# Altium footprint library Capacitor.PcbLib: 59 footprints (part 2 of 4)
Each footprint in its own frame and in the unit in brackets; x right, y up, seen from the top. Pads: shape width x height; smd on the part's side, far side on the other; paste and mask are expansions set on the pad; w line width, h text height; cw(c..) or ccw(c..) is an arc to the next point about the centre after c.
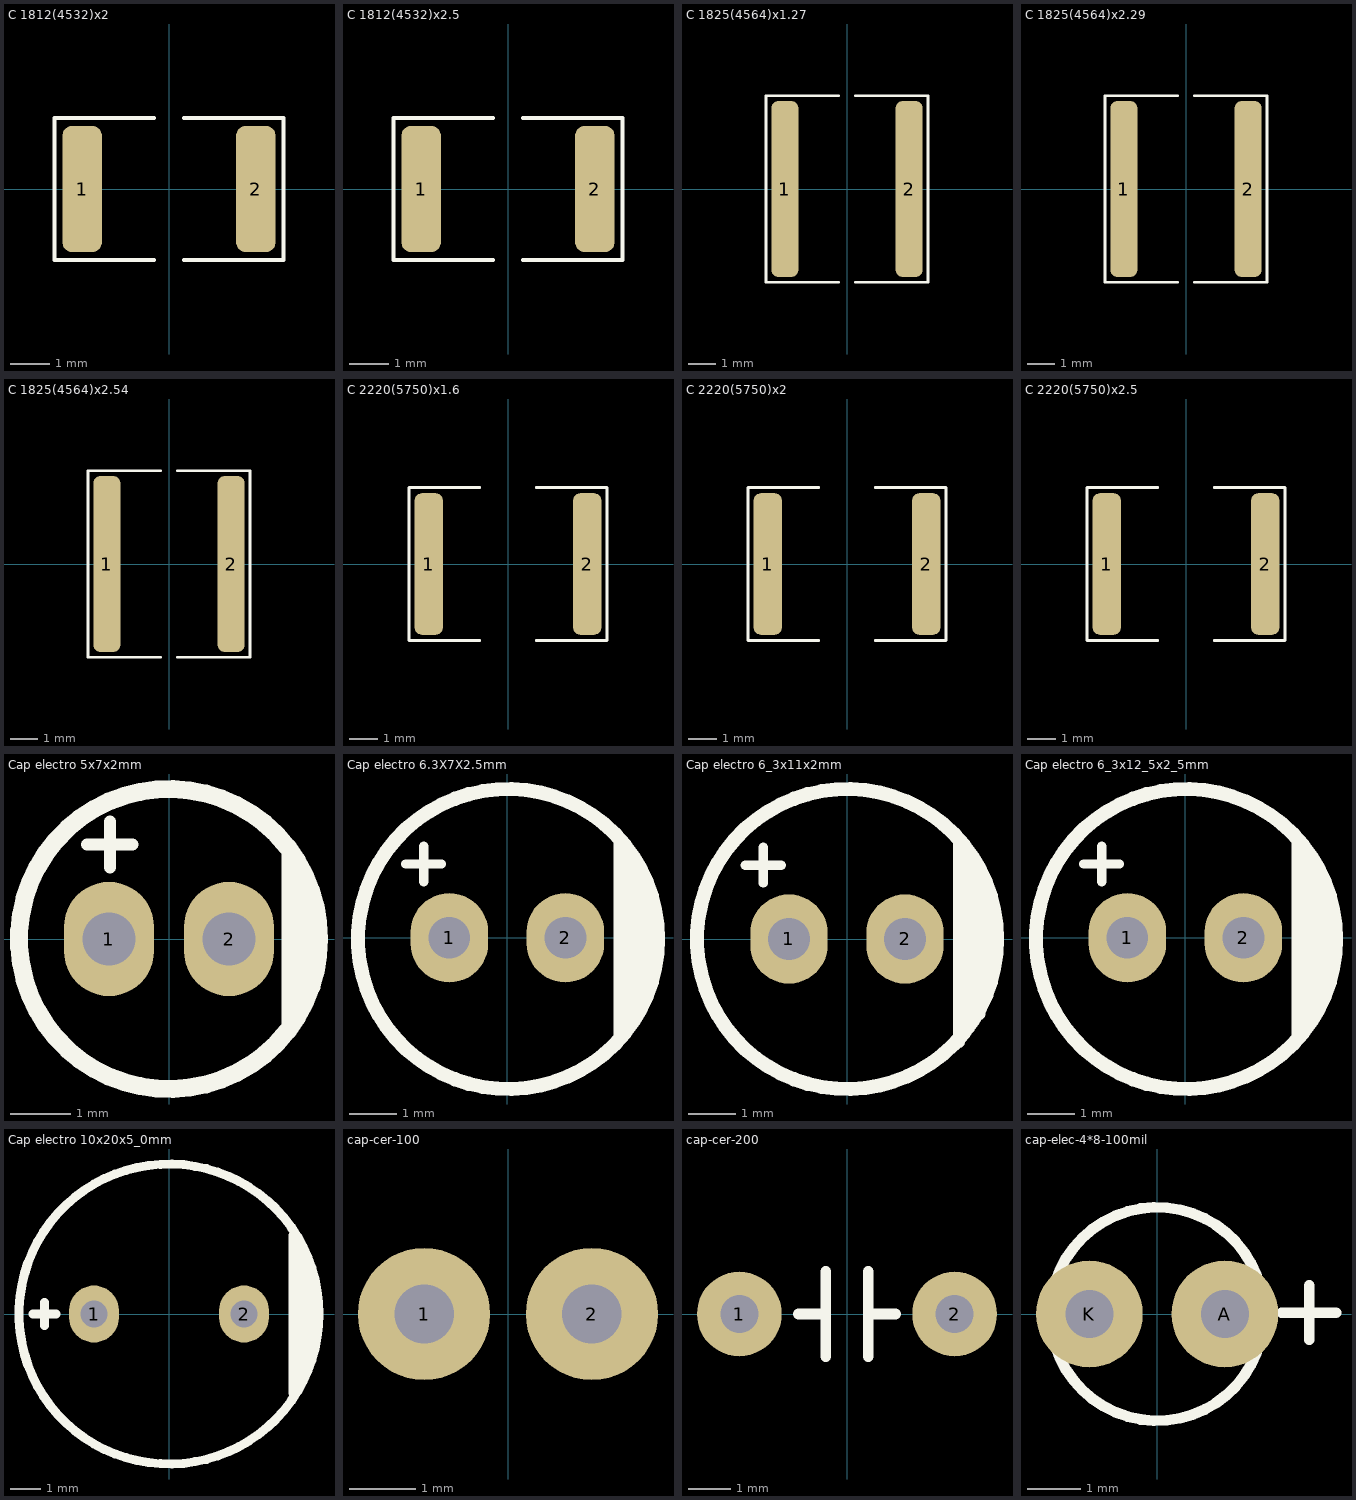
[diagram p1: the footprints below, top view; thin cyan lines are the x and y axes]

## C 1812(4532)x2 [mm]
height 2
pads (2):
  rrect50% 1x3.2 smd: 1(-2.2,0) 2(2.2,0)
Top Overlay:
  lines w0.1: -0.375,-1.8 -2.9,-1.8 -2.9,1.8 -0.375,1.8 ; 0.375,-1.8 2.9,-1.8 2.9,1.8 0.375,1.8
3D body "Cap 1812(4532)x200N.STEP": height 2.01, standoff 0, extent -2.25,-1.6 2.25,1.6

## C 1812(4532)x2.5 [mm]
height 2.5
pads (2):
  rrect50% 1x3.2 smd: 1(-2.2,0) 2(2.2,0)
Top Overlay:
  lines w0.1: -0.375,-1.8 -2.9,-1.8 -2.9,1.8 -0.375,1.8 ; 0.375,-1.8 2.9,-1.8 2.9,1.8 0.375,1.8
3D body "Cap 1812(4532)x250N.STEP": height 2.51, standoff 0, extent -2.25,-1.6 2.25,1.6

## C 1825(4564)x1.27 [mm]
height 1.27
pads (2):
  rrect50% 1x6.5 smd: 1(-2.3,0) 2(2.3,0)
Top Overlay:
  lines w0.1: -0.3,-3.45 -3,-3.45 -3,3.45 -0.3,3.45 ; 0.3,-3.45 3,-3.45 3,3.45 0.3,3.45
3D body "Cap 1825(4564)x127N.STEP": height 1.28, standoff 0, extent -2.25,-3.2 2.25,3.2

## C 1825(4564)x2.29 [mm]
height 2.29
pads (2):
  rrect50% 1x6.5 smd: 1(-2.3,0) 2(2.3,0)
Top Overlay:
  lines w0.1: -0.3,-3.45 -3,-3.45 -3,3.45 -0.3,3.45 ; 0.3,-3.45 3,-3.45 3,3.45 0.3,3.45
3D body "Cap 1825(4564)x229N.STEP": height 2.3, standoff 0, extent -2.25,-3.2 2.25,3.2

## C 1825(4564)x2.54 [mm]
height 2.54
pads (2):
  rrect50% 1x6.5 smd: 1(-2.3,0) 2(2.3,0)
Top Overlay:
  lines w0.1: -0.3,-3.45 -3,-3.45 -3,3.45 -0.3,3.45 ; 0.3,-3.45 3,-3.45 3,3.45 0.3,3.45
3D body "Cap 1825(4564)x254N.STEP": height 2.55, standoff 0, extent -2.25,-3.2 2.25,3.2

## C 2220(5750)x1.6 [mm]
height 1.6
pads (2):
  rrect50% 1x5 smd: 1(-2.8,0) 2(2.8,0)
Top Overlay:
  lines w0.1: -1,-2.7 -3.5,-2.7 -3.5,2.7 -1,2.7 ; 1,-2.7 3.5,-2.7 3.5,2.7 1,2.7
3D body "Cap 2220(5750)x160N.STEP": height 1.61, standoff 0, extent -2.85,-2.5 2.85,2.5

## C 2220(5750)x2 [mm]
height 2
pads (2):
  rrect50% 1x5 smd: 1(-2.8,0) 2(2.8,0)
Top Overlay:
  lines w0.1: -1,-2.7 -3.5,-2.7 -3.5,2.7 -1,2.7 ; 1,-2.7 3.5,-2.7 3.5,2.7 1,2.7
3D body "Cap 2220(5750)x200N.STEP": height 2.01, standoff 0, extent -2.85,-2.5 2.85,2.5

## C 2220(5750)x2.5 [mm]
height 2.5
pads (2):
  rrect50% 1x5 smd: 1(-2.8,0) 2(2.8,0)
Top Overlay:
  lines w0.1: -1,-2.7 -3.5,-2.7 -3.5,2.7 -1,2.7 ; 1,-2.7 3.5,-2.7 3.5,2.7 1,2.7
3D body "Cap 2220(5750)x250N.STEP": height 2.51, standoff 0, extent -2.85,-2.5 2.85,2.5

## Cap electro 5x7x2mm [mm]
pads (2):
  oval 1.5x1.905 hole 0.889: 1(-1,0) 2(1,0)
Top Overlay:
  circle w0.3: c0,0 r2.5
  lines w0.2: -1.368,1.575 -0.606,1.575 ; -0.987,1.194 -0.987,1.956
  lines w0.254: 2.006,-1.5 2.006,1.5 ; 2.226,-1.1 2.226,1.1 ; 2.4,-0.8 2.4,0.7
3D body "User Library-Cap electro 5x7x2mm.STEP": height 7.53, standoff -3.27, extent -2.525,-2.525 2.526,2.525

## Cap electro 6.3X7X2.5mm [mil]
pads (2):
  oval 65x75 hole 35: 1(-48.72,0) 2(48.72,0)
Top Overlay:
  circle w11.81: c0.49,-0.98 r125.98
  lines w7.87: -85.37,62.01 -55.37,62.01 ; -70.37,47.01 -70.37,77.01
  lines w10: 93.92,-82.68 93.92,82.68 ; 102.58,-70.87 102.58,70.87 ; 111.24,-59.06 111.24,55.12 ; 118.11,-43.31 118.11,39.37
3D body "User Library-Cap electro 6_3x7x2_5mm.STEP": height 296.28, standoff -118.67, extent -125.01,-125.01 125.02,125.02

## Cap electro 6_3x11x2mm [mil]
pads (2):
  oval 65x75 hole 35: 1(-48.72,0) 2(48.72,0)
Top Overlay:
  circle w11.81: c0,0 r125.98
  lines w7.87: -85.37,62.01 -55.37,62.01 ; -70.37,47.01 -70.37,77.01
  lines w10: 93.92,-86.61 93.92,78.74 ; 102.58,-74.8 102.58,66.93 ; 111.24,-62.99 111.24,51.18 ; 118.11,-47.24 118.11,35.43
3D body "User Library-Cap electro 6_3x11x2mm.STEP": height 453.76, standoff -128.81, extent -125.01,-125.01 125.02,125.02

## Cap electro 6_3x12_5x2_5mm [mil]
pads (2):
  oval 65x75 hole 35: 1(-48.72,0) 2(48.72,0)
Top Overlay:
  circle w11.81: c0.49,-0.98 r125.98
  lines w7.87: -85.37,62.01 -55.37,62.01 ; -70.37,47.01 -70.37,77.01
  lines w10: 93.92,-82.68 93.92,82.68 ; 102.58,-70.87 102.58,70.87 ; 111.24,-59.06 111.24,55.12 ; 118.11,-43.31 118.11,39.37
3D body "User Library-Cap electro 6_3x12_5x2_5mm.STEP": height 512.81, standoff -118.67, extent -125.01,-125.01 125.02,125.02

## Cap electro 10x20x5_0mm [mil]
pads (2):
  oval 65x75 hole 35: 1(-98.43,0) 2(98.43,0)
Top Overlay:
  circle w11.81: c0,0 r196.85
  lines w7.87: 193.03,-43.7 193.03,42.13
  lines w10: 161.54,-103.94 161.54,103.15 ; 168.23,-95.28 168.23,94.88 ; 176.89,-81.5 176.89,81.89 ; 185.55,-63.78 185.55,64.17
  lines w11.81: -178.56,0 -148.56,0 ; -163.56,-15 -163.56,15
3D body "User Library-Cap electro 10x20x5_0mm.STEP": height 808.09, standoff -147.28, extent -199.23,-199.66 196.47,196.04

## cap-cer-100 [mm] "Ceramic Capacitor - 100mil Pitch"
pads (2):
  round 2 hole 0.9: 1(-1.27,0) 2(1.27,0)
3D body "User Library-Capacitor ceramico 0_2in pitch.STEP": height 6.5, standoff -2.33, extent -2.75,-1.25 2.75,1.25

## cap-cer-200 [mm] "Ceramic Capacitor - 200mil Pitch"
pads (2):
  round 2 hole 0.9: 1(-2.54,0) 2(2.54,0)
Top Overlay:
  lines w0.254: -1.143,0 -0.5,0 ; -0.5,-1 -0.5,1 ; 0.5,-1 0.5,1 ; 0.5,0 1.143,0
3D body "User Library-Ceramic Disc Capacitor 0_2in pitch.STEP": height 7, standoff -1.5, extent -3.491,-0.848 3.5,0.848

## cap-elec-4*8-100mil [mm] "Radial Electrolytic Capacitor - Dimenssion 4*8 (D,H) - 100mil Pitch"
height 8
pads (2):
  round 2 hole 0.9: A(1.27,0) K(-1.27,0)
Top Overlay:
  circle w0.2: c0,0 r2
  lines w0.2: 2.337,0.025 3.353,0.025 ; 2.851,-0.483 2.851,0.533